# Altium footprint library GPRS 3G模块.PcbLib: 4 footprints
Each footprint in its own frame and in the unit in brackets; x right, y up, seen from the top. Pads: shape width x height; smd on the part's side, far side on the other; paste and mask are expansions set on the pad; w line width, h text height; cw(c..) or ccw(c..) is an arc to the next point about the centre after c.

## MU609-PCIE [mm]
3D body: height 2.8, standoff -2.7, extent -15.2,-27.79 15.2,27.79

## SIM300D [mm]
3D body: height 3.06, standoff 0, extent -16.502,-16.502 16.5,16.502

## SIM900 [mm]
3D body: height 3, standoff 0, extent -12.005,-12.005 12.005,12.005

## SIM900A [mm]
3D body: height 3, standoff 0, extent -12.005,-12.005 12.005,12.005